# Altium footprint library MEBot.PcbLib: 161 footprints (part 4 of 11)
Each footprint in its own frame and in the unit in brackets; x right, y up, seen from the top. Pads: shape width x height; smd on the part's side, far side on the other; paste and mask are expansions set on the pad; w line width, h text height; cw(c..) or ccw(c..) is an arc to the next point about the centre after c.
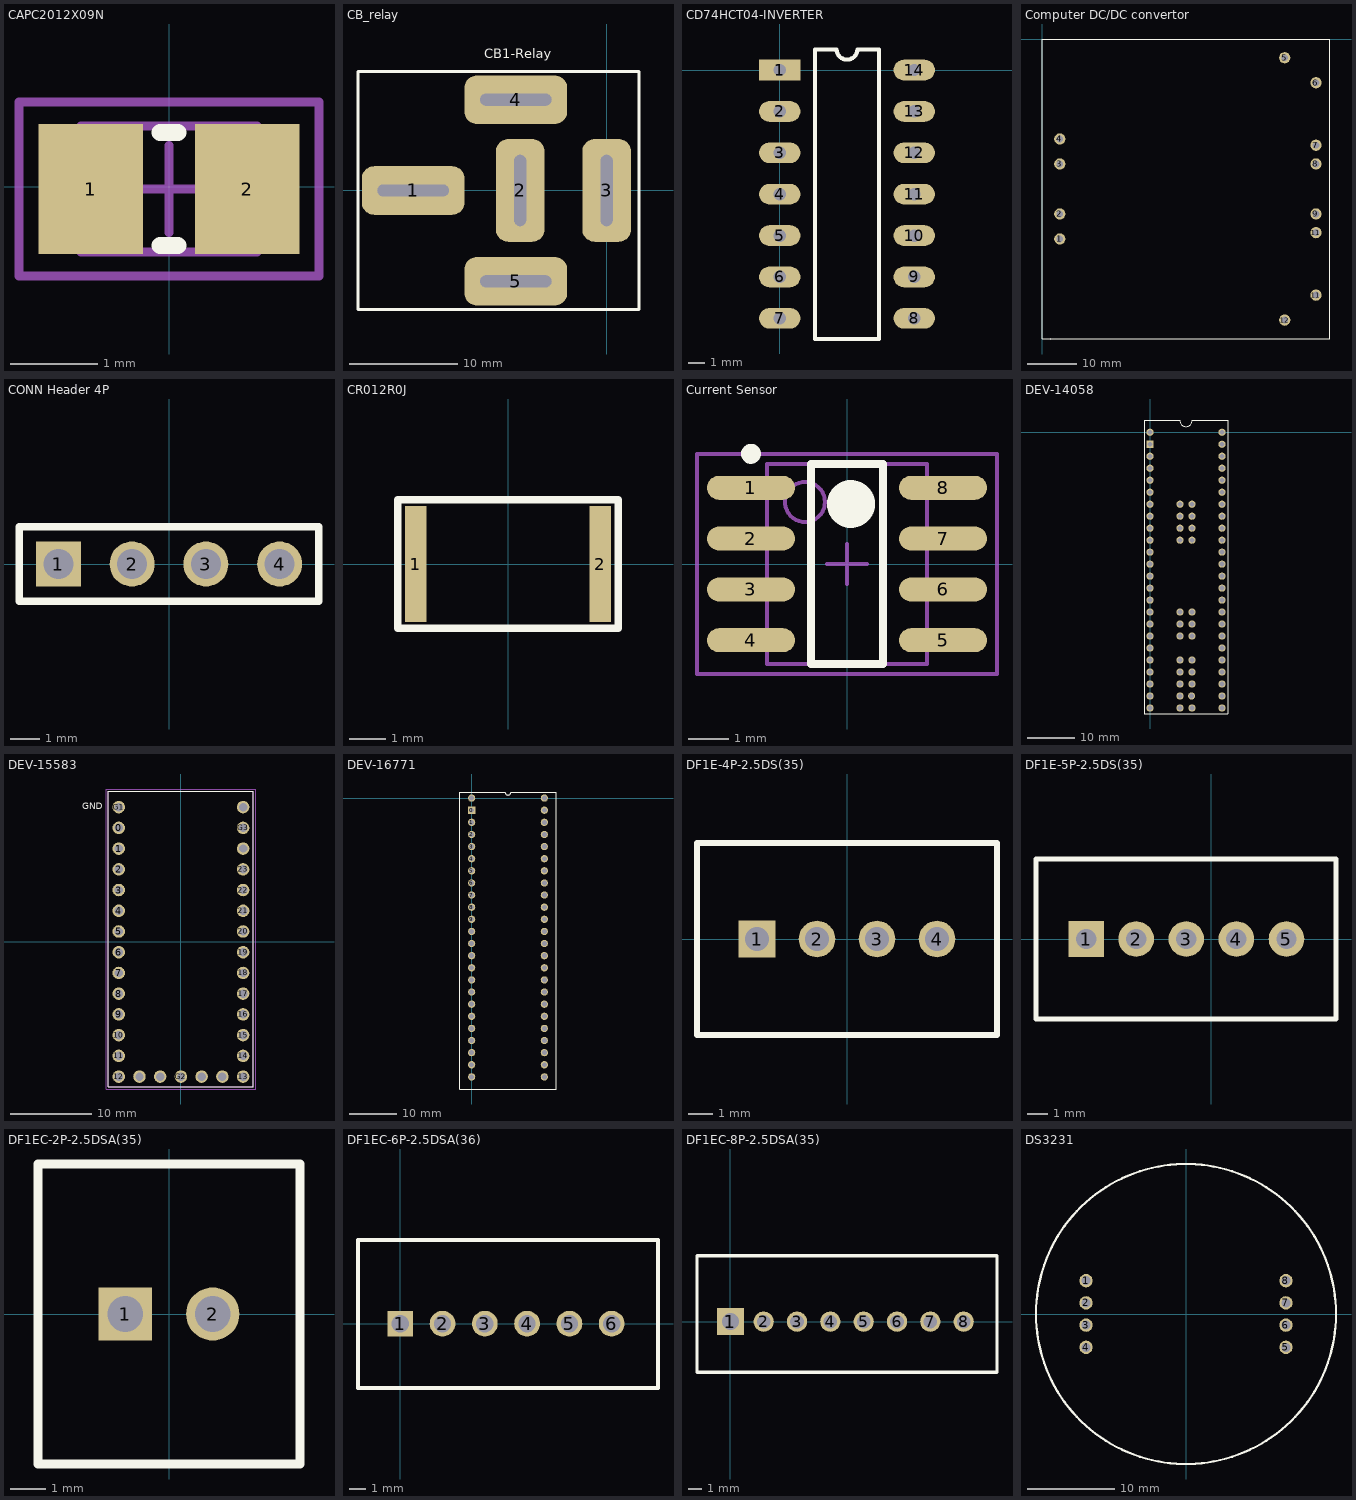
[diagram p3: the footprints below, top view; thin cyan lines are the x and y axes]

## CAPC2012X09N [mm] "Chip Capacitor, 2-Leads, Body 2.0x1.3mm, IPC Medium Density"
pads (2):
  rect 1.2x1.5 smd: 1(-0.9,-0.027) 2(0.9,-0.027)
Top Overlay:
  lines w0.2: -0.1,-0.677 0.1,-0.677 ; -0.1,0.623 0.1,0.623
Mechanical 13:
  lines w0.1: -1.015,-0.752 1.015,-0.752 1.015,0.698 -1.015,0.698 -1.015,-0.752
Mechanical 15:
  lines w0.1: -0.5,-0.027 0.5,-0.027 ; 0,-0.527 0,0.473 ; -1.725,-1.027 1.725,-1.027 1.725,0.973 -1.725,0.973 -1.725,-1.027
3D body: height 0.94, standoff 0, extent -1.015,-0.752 1.015,0.698

## CB_relay [mm] "Panasonic SPDT relay (24v coil, 40A)"
pads (5):
  rrect50% 9.5x4.5 hole 1.1 slot 6.6 at 0 deg: 1(-17.9,0) 4(-8.4,8.4) 5(-8.4,-8.4)
  rrect50% 4.5x9.5 hole 1.1 slot 6.6 at 90 deg: 2(-8,0) 3(0,0)
Top Overlay:
  lines w0.254: -23,-11 -23,11 3,11 3,-11 -23,-11
  text "CB1-Relay" at -11.3,11.9 h1.52

## CD74HCT04-INVERTER [mil]
pads (14):
  rect 100x50 hole 30: 1(0,0)
  oval 100x50 hole 30: 2(0,-100) 3(0,-200) 4(0,-300) 5(0,-400) 6(0,-500) 7(0,-600) 8(325,-600) 9(325,-500) 10(325,-400) 11(325,-300) 12(325,-200) 13(325,-100) 14(325,0)
Top Overlay:
  lines w10: 85,-650 240,-650 240,50 187.5,50 cw(c162.5,50) 137.5,50 85,50 85,-650

## Computer DC/DC convertor [mil]
pads (12):
  round 90 hole 55: 1(140,-1600) 2(140,-1400) 3(140,-1000) 4(140,-800) 5(1940.16,-150) 6(2190.16,-350) 7(2190.16,-850) 8(2190.16,-1000) 9(2190.16,-1400) 11(2190,-2050) 11(2190.16,-1550) 12(1940,-2250)
Top Overlay:
  lines w10: 58,-2393 66,-2401 ; 0,-2400 0,0 2300,0 2300,-2400 0,-2400

## CONN Header 4P [mil] "2.5mm pitch header for full lock & discrete wire connection"
height 433.07
pads (4):
  rect 60x60 hole 40: 1(-147.64,0)
  round 60 hole 40: 2(-49.21,0) 3(49.21,0) 4(147.64,0)
Top Overlay:
  lines w10: -200,-50 200,-50 200,50 -200,50 -200,-50
3D body "Downlaod_STP_61300411121 (rev1).stp": height 336.22, standoff -118.11, extent -200,-50 200,50

## CR012R0J [mm] "RESISTOR SMD 2OHM 5% 1W 2512"
pads (2):
  rect 0.6x3.2 smd: 1(-2.55,0) 2(2.55,0)
Top Overlay:
  lines w0.2: -3.048,-1.778 -3.048,1.778 3.048,1.778 3.048,-1.778 -3.048,-1.778

## Current Sensor [mm]
height 1.75
pads (8):
  oval 2.2x0.6 smd: 1(-2.4,1.905) 2(-2.4,0.635) 3(-2.4,-0.635) 4(-2.4,-1.905) 5(2.4,-1.905) 6(2.4,-0.635) 7(2.4,0.635) 8(2.4,1.905)
Top Overlay:
  circle w0.25: c-2.4,2.755 r0.125
  circle w0.6: c0.1,1.5 r0.3
  lines w0.2: -0.9,-2.5 -0.9,2.5 0.9,2.5 0.9,-2.5 -0.9,-2.5
Mechanical 13:
  circle w0.1: c-1.05,1.55 r0.5
  lines w0.1: -2,-2.5 -2,2.5 2,2.5 2,-2.5 -2,-2.5
Mechanical 15:
  lines w0.1: -0.5,0 0.5,0 ; 0,-0.5 0,0.5 ; -3.75,-2.75 -3.75,2.75 3.75,2.75 3.75,-2.75 -3.75,-2.75
3D body: height 1.75, standoff 0.1, extent -2,-2.5 2,2.5

## DEV-14058 [mil] "TEENSY 3.6 W/ HDRS K66 EVAL BRD"
pads (72):
  rect 60x60 hole 40: 0(0,-100)
  round 60 hole 40: 1(0,-200) 2(0,-300) 3(0,-400) 4(0,-500) 5(0,-600) 6(0,-700) 7(0,-800) 8(0,-900) 9(0,-1000) 10(0,-1100) 11(0,-1200) 12(0,-1300) 13(600,-1300) 14(600,-1200) 15(600,-1100) 16(600,-1000) 17(600,-900) 18(600,-800) 19(600,-700) 20(600,-600) 21(600,-500) 22(600,-400) 23(600,-300) 24(0,-1500) 25(0,-1600) 26(0,-1700) 27(0,-1800) 28(0,-1900) 29(0,-2000) 30(0,-2100) 31(0,-2200) 32(0,-2300) 33(600,-2300) 34(600,-2200) 35(600,-2100) 36(600,-2000) 37(600,-1900) 38(600,-1800) 39(600,-1700) 40(250,-1500) 41(250,-1600) 42(250,-1700) 43(250,-1900) 44(250,-2000) 45(250,-2100) 46(250,-2200) 47(346.65,-2199.25) 48(350,-2100) 49(350,-2000) 50(350,-1900) 51(350,-1700) 52(350,-1600) 53(350,-1500) 54(350,-900) 55(350,-800) 56(350,-700) 57(350,-600) 58(0,0) 59(600,-1400) 60(350,-2300) 61(0,-1400) 62(600,-200) 63(250,-2300) 64(600,0) 65(600,-100) 66(250,-900) 67(250,-800) 68(250,-700) 69(250,-600) 70(600,-1600) 71(600,-1500)
Top Overlay:
  lines w10: 247.75,100 ccw(c300,100) 352.25,100 ; 250,100 -50,100 -50,-2350 650,-2350 650,100 350,100
3D body "Teensy 3.5 - 3.6.step": height 526.67, standoff 9.45, extent -50,-2350.1 650,105

## DEV-15583 [mm]
pads (33):
  round 1.53 hole 1.02: 0(-7.62,13.97) 1(-7.62,11.43) 2(-7.62,8.89) 3(-7.62,6.35) 3.3V_1(-2.54,-16.51) 3.3V_2(7.62,11.43) 4(-7.62,3.81) 5(-7.62,1.27) 6(-7.62,-1.27) 7(-7.62,-3.81) 8(-7.62,-6.35) 9(-7.62,-8.89) 10(-7.62,-11.43) 11(-7.62,-13.97) 12(-7.62,-16.51) 13(7.62,-16.51) 14(7.62,-13.97) 15(7.62,-11.43) 16(7.62,-8.89) 17(7.62,-6.35) 18(7.62,-3.81) 19(7.62,-1.27) 20(7.62,1.27) 21(7.62,3.81) 22(7.62,6.35) 23(7.62,8.89) G1(-7.62,16.51) G2(0,-16.51) G3(7.62,13.97) ON-OFF(5.08,-16.51) PGM(2.54,-16.51) VBAT(-5.08,-16.51) VIN(7.62,16.51)
Top Overlay:
  lines w0.127: -8.89,-17.78 8.89,-17.78 8.89,18.48 -8.89,18.48 -8.89,-17.78
  text "GND" at -12.065,16.256 h0.81
Mechanical 13:
  lines w0.127: -8.89,-17.78 8.89,-17.78 8.89,18.48 -8.89,18.48 -8.89,-17.78
  text "GND" at -12.065,16.256 h0.81
Mechanical 15:
  lines w0.05: -9.14,-18.03 -9.14,18.73 9.14,18.73 9.14,-18.03 -9.14,-18.03
3D body "DEV-15583.step": height 9.46, standoff 3.88, extent -8.89,-17.845 8.89,18.415

## DEV-16771 [mil] "TEENSY 4.1"
pads (48):
  rect 60x60 hole 40: 0(0,-100)
  round 60 hole 40: 1(0,-200) 2(0,-300) 3(0,-400) 4(0,-500) 5(0,-600) 6(0,-700) 7(0,-800) 8(0,-900) 9(0,-1000) 10(0,-1100) 11(0,-1200) 12(0,-1300) 13(600,-1300) 14(600,-1200) 15(600,-1100) 16(600,-1000) 17(600,-900) 18(600,-800) 19(600,-700) 20(600,-600) 21(600,-500) 22(600,-400) 23(600,-300) 24(0,-1500) 25(0,-1600) 26(0,-1700) 27(0,-1800) 28(0,-1900) 29(0,-2000) 30(0,-2100) 31(0,-2200) 32(0,-2300) 33(600,-2300) 34(600,-2200) 35(600,-2100) 36(600,-2000) 37(600,-1900) 38(600,-1800) 39(600,-1700) 40(600,-1600) 41(600,-1500) 42(600,-1400) 43(600,-200) 44(600,-100) 45(600,0) 46(0,0) 47(0,-1400)
Top Overlay:
  lines w10: -100,-2400 -100,50 275,50 ccw(c300,50) 325,50 700,50 700,-2400 -100,-2400
3D body "Teensy 3.5 - 3.6.step": height 476.67, standoff -40.55, extent -50,-2350.1 650,105

## DF1E-4P-2.5DS(35) [mil] "CONN HEADER R/A 4POS 2.5MM"
height 433.07
pads (4):
  rect 60x60 hole 40: 1(-147.64,0)
  round 60 hole 40: 2(-49.21,0) 3(49.21,0) 4(147.64,0)
Top Overlay:
  lines w10: -246.06,-157.48 246.06,-157.48 246.06,157.48 -246.06,157.48 -246.06,-157.48
3D body "hirose_conn_header4pRA.stp": height 373.62, standoff -75.2, extent -246.06,-425 246.06,118.31

## DF1E-5P-2.5DS(35) [mil] "R/A Pin Header 5P"
height 433.07
pads (5):
  rect 70x70 hole 40: 1(-246.06,0)
  round 70 hole 40: 2(-147.64,0) 3(-49.21,0) 4(49.21,0) 5(147.64,0)
Top Overlay:
  lines w10: -344.49,-157.48 245,-157.48 245,157.48 -344.49,157.48 -344.49,-157.48
3D body "DF1E-5P-2.5DS.stp": height 343.62, standoff -105.2, extent -345.28,-120 245.28,423.31

## DF1EC-2P-2.5DSA(35) [mil] "CONN HEADER VERT 2POS 2.5MM"
height 433.07
pads (2):
  rect 60x60 hole 40: 1(-49.21,0)
  round 60 hole 40: 2(49.21,0)
Top Overlay:
  lines w10: -147.64,-169 147.64,-169 147.64,169 -147.64,169 -147.64,-169
3D body "DF1EC-2P-2.5DSA.stp": height 141.73, standoff -425.2, extent -147.64,-189.65 147.64,145

## DF1EC-6P-2.5DSA(36) [mil] "CONN HEADER VERT 6POS 2.5MM"
height 433.07
pads (6):
  rect 60x60 hole 40: 1(0,0)
  round 60 hole 40: 2(98.43,0) 3(196.85,0) 4(295.28,0) 5(393.7,0) 6(492.13,0)
Top Overlay:
  lines w10: -98.43,-150 600,-150 600,195 -98.43,195 -98.43,-150
3D body "DF1EC-6P-2.5DSA.stp": height 425.2, standoff -141.73, extent -99.48,-144.64 589.49,190

## DF1EC-8P-2.5DSA(35) [mil] "CONN HEADER VERT 8POS 2.5MM"
height 433.07
pads (8):
  rect 80x80 hole 50: 1(0,0)
  round 60 hole 40: 2(98.43,0) 3(196.85,0) 4(295.28,0) 5(393.7,0) 6(492.13,0) 7(590.55,0) 8(688.98,0)
Top Overlay:
  lines w10: -98.43,-150 787.4,-150 787.4,195 -98.43,195 -98.43,-150
3D body "DF1EC-8P-2.5DSA.stp": height 425.2, standoff -141.73, extent -97.9,-145.82 787.92,188.83

## DS3231 [mil] "ChibbirDot v2.1"
pads (8):
  round 60 hole 40: 1(-450,150) 2(-450,50) 3(-450,-50) 4(-450,-150) 5(450,-150) 6(450,-50) 7(450,50) 8(450,150)
Top Overlay:
  circle w10: c0,0 r675.35